# Altium footprint library PCB_ConnectorHDR.PcbLib: 134 footprints (part 9 of 9)
Each footprint in its own frame and in the unit in brackets; x right, y up, seen from the top. Pads: shape width x height; smd on the part's side, far side on the other; paste and mask are expansions set on the pad; w line width, h text height; cw(c..) or ccw(c..) is an arc to the next point about the centre after c.
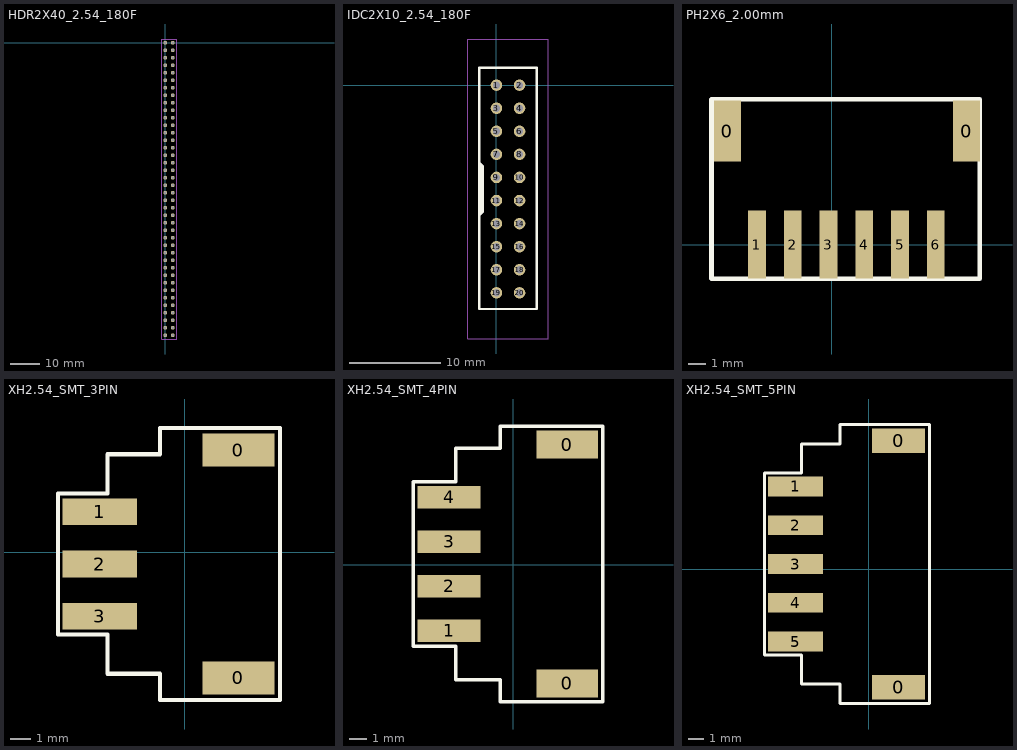
[diagram p8: the footprints below, top view; thin cyan lines are the x and y axes]

## HDR2X40_2.54_180F [mil]
height 169.29
pads (80):
  round 50 hole 32: 1(0,0) 2(100,0) 3(0,-100) 4(100,-100) 5(0,-200) 6(100,-200) 7(0,-300) 8(100,-300) 9(0,-400) 10(100,-400) 11(0,-500) 12(100,-500) 13(0,-600) 14(100,-600) 15(0,-700) 16(100,-700) 17(0,-800) 18(100,-800) 19(0,-900) 20(100,-900) 21(0,-1000) 22(100,-1000) 23(0,-1100) 24(100,-1100) 25(0,-1200) 26(100,-1200) 27(0,-1300) 28(100,-1300) 29(0,-1400) 30(100,-1400) 31(0,-1500) 32(100,-1500) 33(0,-1600) 34(100,-1600) 35(0,-1700) 36(100,-1700) 37(0,-1800) 38(100,-1800) 39(0,-1900) 40(100,-1900) 41(0,-2000) 42(100,-2000) 43(0,-2100) 44(100,-2100) 45(0,-2200) 46(100,-2200) 47(0,-2300) 48(100,-2300) 49(0,-2400) 50(100,-2400) 51(0,-2500) 52(100,-2500) 53(0,-2600) 54(100,-2600) 55(0,-2700) 56(100,-2700) 57(0,-2800) 58(100,-2800) 59(0,-2900) 60(100,-2900) 61(0,-3000) 62(100,-3000) 63(0,-3100) 64(100,-3100) 65(0,-3200) 66(100,-3200) 67(0,-3300) 68(100,-3300) 69(0,-3400) 70(100,-3400) 71(0,-3500) 72(100,-3500) 73(0,-3600) 74(100,-3600) 75(0,-3700) 76(100,-3700) 77(0,-3800) 78(100,-3800) 79(0,-3900) 80(100,-3900)
T-Component:
  lines w2: -50,-3950 -50,50 150,50 150,-3950 -50,-3950
3D body "female_header_a-bl254-dg-g80d.stp": height 334.65, standoff -125.98, extent -48.42,-3954.92 148.43,54.93

## IDC2X10_2.54_180F [mil]
height 169.29
pads (20):
  round 50 hole 32: 1(0,0) 2(100,0) 3(0,-100) 4(100,-100) 5(0,-200) 6(100,-200) 7(0,-300) 8(100,-300) 9(0,-400) 10(100,-400) 11(0,-500) 12(100,-500) 13(0,-600) 14(100,-600) 15(0,-700) 16(100,-700) 17(0,-800) 18(100,-800) 19(0,-900) 20(100,-900)
Top Overlay:
  region: -75,-335 -75,-565 -60,-550 -60,-350
  lines w10: -75,-565 -75,-335 ; -75,-565 -75,-970 175,-970 175,75 -75,75 -75,-335 ; -75,-565 -60,-550 -60,-350 -75,-335
Mechanical 13:
  lines w2: -125,-1100 -125,200 225,200 225,-1100 -125,-1100
T-Component:
  lines w2: -125,-1100 225,-1100 225,200 -125,200 -125,-1100
3D body "SW3dPS-PinBox Connector_20Pin.STEP": height 429.13, standoff -118.11, extent -123.23,-1100 223.23,199.21

## PH2X6_2.00mm [mm]
pads (8):
  rect 1.5x3.4 smd: 0(-5.842,6.35) 0(7.531,6.35)
  rect 1x3.8 smd: 1(-4.191,0) 2(-2.191,0) 3(-0.191,0) 4(1.809,0) 5(3.809,0) 6(5.809,0)
Top Overlay:
  lines w0.254: -6.731,-1.905 -6.731,8.128 8.255,8.128 8.255,-1.905 -4.445,-1.905 -6.731,-1.905

## XH2.54_SMT_3PIN [mm]
pads (5):
  rect 3.5x1.6 smd: 0(2.608,-6.102) 0(2.608,4.978)
  rect 3.6x1.3 smd: 1(-4.133,1.978) 2(-4.133,-0.562) 3(-4.133,-3.102)
Top Overlay:
  lines w0.2: -6.165,-3.991 -6.165,2.867 -3.752,2.867 -3.752,4.772 -1.212,4.772 -1.212,6.042 4.63,6.042 4.63,-7.166 -1.212,-7.166 -1.212,-5.896 -3.752,-5.896 -3.752,-3.991 -6.165,-3.991

## XH2.54_SMT_4PIN [mm]
pads (6):
  rect 3.5x1.6 smd: 0(3.067,-6.771) 0(3.067,6.849)
  rect 3.6x1.3 smd: 1(-3.674,-3.771) 2(-3.674,-1.231) 3(-3.674,1.309) 4(-3.674,3.849)
Top Overlay:
  lines w0.2: -5.706,-4.66 -5.706,4.738 -3.293,4.738 -3.293,6.643 -0.753,6.643 -0.753,7.913 5.089,7.913 5.089,-7.835 -0.753,-7.835 -0.753,-6.565 -3.293,-6.565 -3.293,-4.66 -5.706,-4.66

## XH2.54_SMT_5PIN [mm]
pads (7):
  rect 3.5x1.6 smd: 0(1.941,-7.722) 0(1.941,8.438)
  rect 3.6x1.3 smd: 1(-4.8,5.438) 2(-4.8,2.898) 3(-4.8,0.358) 4(-4.8,-2.182) 5(-4.8,-4.722)
Top Overlay:
  lines w0.2: -6.832,-5.611 -6.832,6.327 -4.419,6.327 -4.419,8.232 -1.879,8.232 -1.879,9.502 3.963,9.502 3.963,-6.246 3.963,-8.786 -1.879,-8.786 -1.879,-7.516 -4.419,-7.516 -4.419,-5.611 -6.832,-5.611